# Altium integrated library BK1096.IntLib: 37 symbols
Pins are listed as number, name and electrical type; pins without a type are passive.

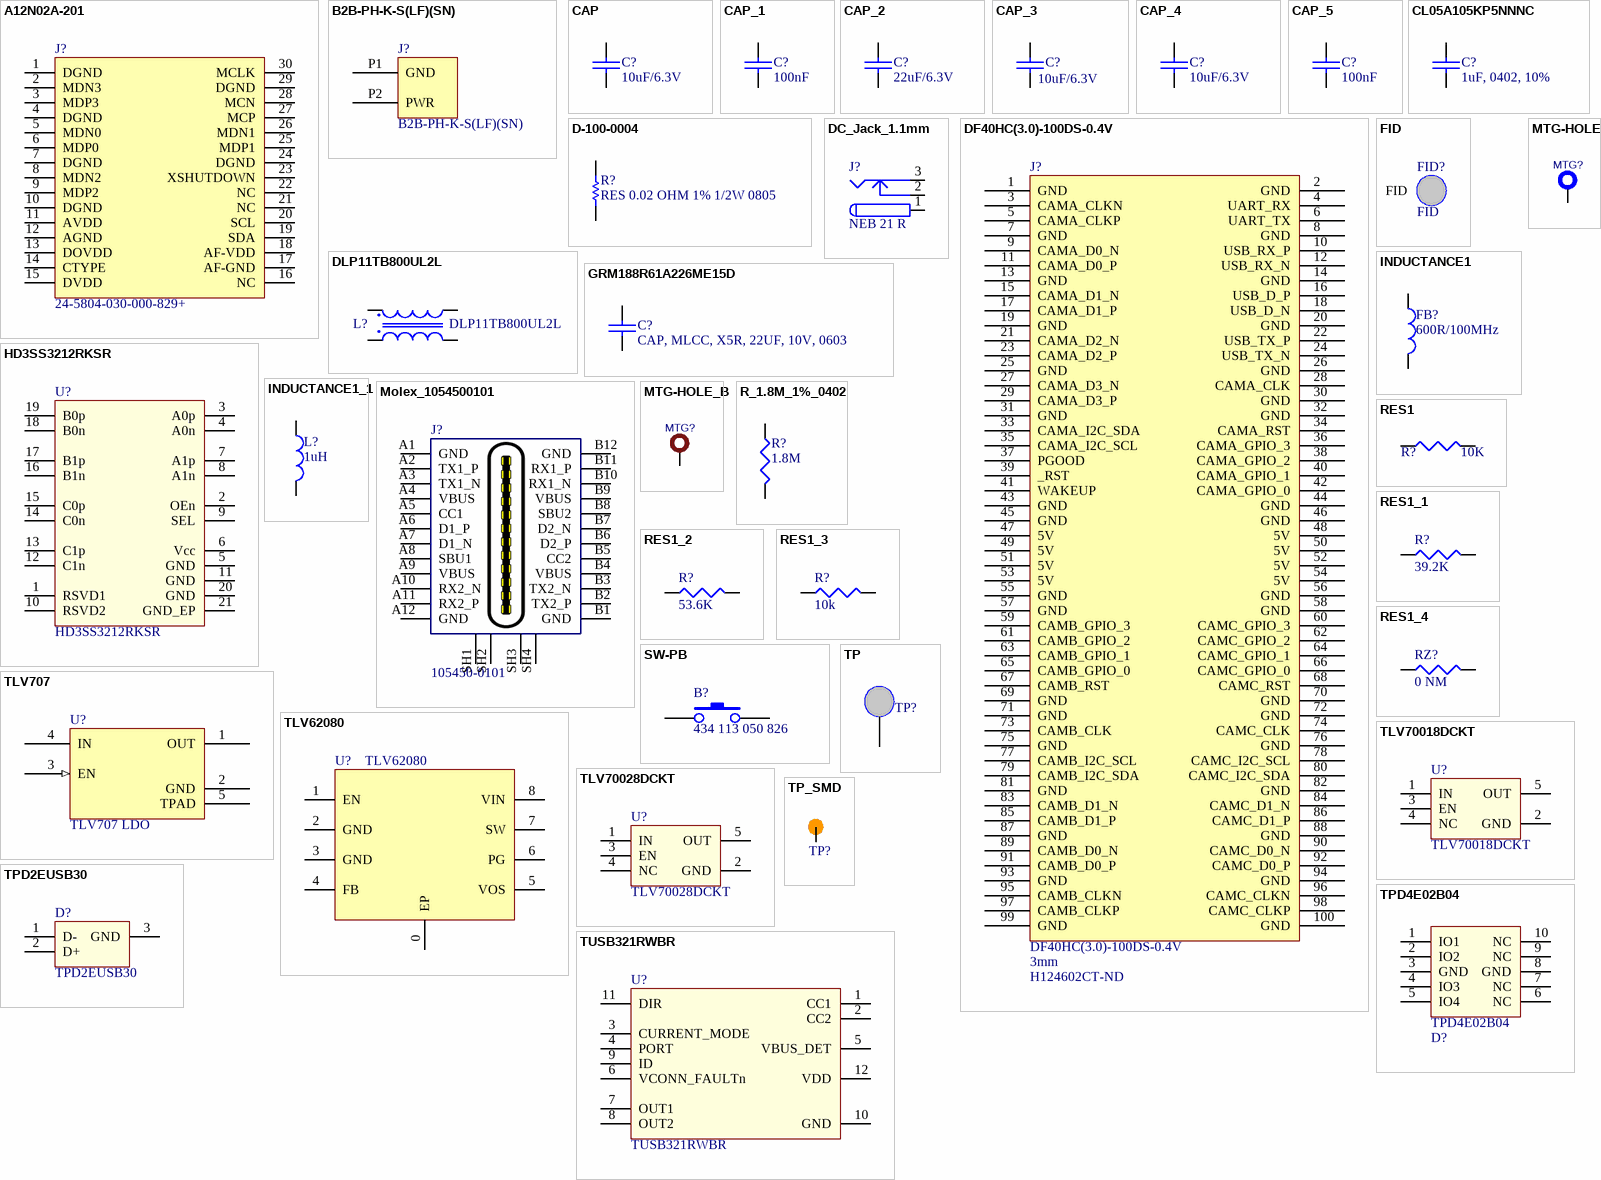
[diagram p0: symbols A12N02A-201 to TUSB321RWBR]

## A12N02A-201
designator J?, comment 24-5804-030-000-829+
Series 5804 board to board 0.4mm pitch 30 way connector; MAN: AVX/KYOCERA; MAN PN: 24-5804-030-000-829+
footprint A12N02A-201
pins: 1 DGND, 2 MDN3, 3 MDP3, 4 DGND, 5 MDN0, 6 MDP0, 7 DGND, 8 MDN2, 9 MDP2, 10 DGND, 11 AVDD, 12 AGND, 13 DOVDD, 14 CTYPE, 15 DVDD, 16 NC, 17 AF-GND, 18 AF-VDD, 19 SDA, 20 SCL, 21 NC, 22 NC, 23 XSHUTDOWN, 24 DGND, 25 MDP1, 26 MDN1, 27 MCP, 28 MCN, 29 DGND, 30 MCLK

## B2B-PH-K-S(LF)(SN)
designator J?
CONN HEADER VERT 2POS 2MM; Manufacturer: JST; Number of Positions: 2; Connector Type: Male Pin; Current Rating: 2A; Gender: Male; Contact Resistance: 20mR; Insulation Resistance: 1MR; Voltage Rating: 100V; Supplier 1: Digi-Key; Manufacturer Part Number: B2B-PH-K-S(LF)(SN); Stock 1: 216199; Pricing 1: 1 = 0.170000, 10 = 0.162000, 100 = 0.100200, 500 = 0.082880, 1000 = 0.072520, 5000 = 0.062160, 10000 = 0.060440 (USD); RoHS: Yes; Mount: Through Hole; Number of Pins: 2; Contact Plating: Tin; Color: Natural; Contact Material: Brass; Housing Material: Polyamide; Housing Color: White; Min Operating Temperature: -25°C; Max Operating Temperature: 85°C; Number of Rows: 1; Packaging: Bulk; Termination: Solder; Fastening Type: Detent; Number of Poles: 2; Number of Contacts: 2; Orientation: Straight; Max Current Rating: 2A; Max Voltage Rating (AC): 100V; Voltage Rating (AC): 100V; Working Voltage: 100V; Max Voltage Rating (DC): 100V; Length: 5.9mm; Height: 9.4mm; Pitch: 2mm; Width: 4.5mm; Contact Mating Length: 0.13inch; Depth: 4.5mm; Lead Pitch: 2mm; Lead Free: Lead Free; REACH SVHC: No SVHC; ComponentLink1URL: https://datasheet.ciiva.com/6747/80560-6747392.pdf?src-supplier=Newark; ComponentLink1Description: https://datasheet.ciiva.com/6747/80560-6747392.pdf?src-supplier=Newark; ComponentLink2URL: https://datasheet.ciiva.com/11746/0900766b8082f551-11746676.pdf?src-supplier=RSComponents; ComponentLink2Description: https://datasheet.ciiva.com/11746/0900766b8082f551-11746676.pdf?src-supplier=RSComponents; ComponentLink3URL: https://datasheet.ciiva.com/8052/80560-8052022.pdf?src-supplier=Element14; ComponentLink3Description: https://datasheet.ciiva.com/8052/80560-8052022.pdf?src-supplier=Element14; ComponentLink4URL: https://datasheet.ciiva.com/712/eph-712442.pdf?src-supplier=Digi-Key; ComponentLink4Description: https://datasheet.ciiva.com/712/eph-712442.pdf?src-supplier=Digi-Key; ComponentLink5URL: https://datasheet.ciiva.com/16422/b2b-ph-k-slfsn-16422715.pdf?src-supplier=Future+Electronics; ComponentLink5Description: https://datasheet.ciiva.com/16422/b2b-ph-k-slfsn-16422715.pdf?src-supplier=Future+Electronics; Supplier Part Number 1: 455-1704-ND
footprint *JST_B2B-PH-K-S(LF)(SN)
pins: P1 GND, P2 PWR

## CAP
designator C?, comment 10uF/6.3V
SMD Multilayer Ceramic Capacitor, 0603 [1608 Metric], 10 µF, 6.3 V, ± 20%, X5R; MAN: Yageo(PHYCOM); MAN PN: CC0603MRX5R5BB106; ICCO PN: MV122009; DIST: Farnell; DIST PN: 1458902
footprint 0603 (chip 0603)
footprint CAPC0603(1608)55_M (Chip Capacitor, Body 1.6x0.8mm, Height 0.55mm, IPC Low Density)
footprint CAPC0603(1608)55_N (Chip Capacitor, Body 1.6x0.8mm, Height 0.55mm, IPC Medium Density)
pins: 1, 2

## CAP_1
designator C?, comment 100nF
SMD Multilayer Ceramic Capacitor, 0402 [1005 Metric], 0.1 µF, 10 V, ± 10%, X5R; MAN: Kemet; MAN PN: C0402C104K8PACTU; ICCO PN: MV122005; DIST: Farnell; DIST PN: 2392235
footprint 0402 (chip 0402)
footprint CAPC0402(1005)60_M (Chip Capacitor, Body 1.0x0.5mm, Height 0.6mm, IPC Low Density)
footprint CAPC0402(1005)60_N (Chip Capacitor, Body 1.0x0.5mm, Height 0.6mm, IPC Medium Density)
pins: 1, 2

## CAP_2
designator C?, comment 22uF/6.3V
SMD Multilayer Ceramic Capacitor, 0805 [2012 Metric], 22 µF, 6.3 V, ± 10%, X5R; MAN: TAIYO YUDEN; MAN PN: JMK212BJ226KG-T; ICCO PN: MV122020; DIST PN: 2113069; DIST: Farnell
footprint 0805 (chip 0805)
pins: 1, 2

## CAP_3
designator C?, comment 10uF/6.3V
CERAMIC CAPACITOR, 10UF, 6.3V, X5R, 20%, 0805; MAN: TAIYO YUDEN; MAN PN: JMK212BJ106MG-T; ICCO PN: M1V10010; DIST PN: 2372273; DIST: Farnell
footprint 0805 (chip 0805)
pins: 1, 2

## CAP_4
designator C?, comment 10uF/6.3V
SMD Multilayer Ceramic Capacitor, 0402 [1005 Metric], 10 µF, 6.3 V, ± 20%, X5R; E - MFG: MuRata; F - MFG P/N: GRM155R60J106ME44D
footprint CAP_0402
footprint CAPC0402(1005)70_L (Chip Capacitor, Body 1.0x0.5mm, Height 0.7mm, IPC High Density)
footprint CAPC0402(1005)70_N (Chip Capacitor, Body 1.0x0.5mm, Height 0.7mm, IPC Medium Density)
pins: 1, 2

## CAP_5
designator C?, comment 100nF
SMD Multilayer Ceramic Capacitor, 0201 [0603 Metric], 0.1 µF, 6.3 V, ± 10%, X5R; B - Value: 0.1uF; C - Notes: 0201  0.1 µF, 6.3 V, ± 10%, X5R; E - MFG: MuRata; F - MFG P/N: GRM033R60J104KE19D
footprint CAPC0201(0603)33_M (Chip Capacitor, Body 0.6x0.3mm, Height 0.33mm, IPC Low Density)
footprint CAPC0201(0603)33_N (Chip Capacitor, Body 0.6x0.3mm, Height 0.33mm, IPC Medium Density)
footprint CAPC0201(0603)33_L (Chip Capacitor, Body 0.6x0.3mm, Height 0.33mm, IPC High Density)
pins: 1, 2

## CL05A105KP5NNNC
designator C?, comment 1uF, 0402, 10%
Cap Ceramic 1uF 10V X5R 10% SMD 0402 85C Paper T/R; Manufacturer: Samsung; Manufacturer Part Number: CL05A105KP5NNNC; Supplier 1: Digi-Key; Stock 1: 13690251; Pricing 1: 1 = 0.10000, 10 = 0.04200, 100 = 0.01880, 500 = 0.01340, 1000 = 0.01053, 2500 = 0.00958, 5000 = 0.00881 (USD); RoHS: Yes; Mount: Surface Mount; Case/Package: 0402; Case Code (Metric): 1005; Case Code (Imperial): 0402; Material: Ceramic; Contact Plating: Tin; Min Operating Temperature: -55°C; Max Operating Temperature: 85°C; Capacitance: 1uF; Tolerance: 10%; Packaging: Tape and Reel; Voltage Rating: 10V; Dielectric: X5R; Package Quantity: 1; Length: 1mm; Height: 0.5mm; Width: 0.02inch; Thickness: 0.022inch; Depth: 0.5mm; Radiation Hardening: No; ComponentLink1URL: https://datasheet.ciiva.com/15195/getdatasheetpartid-358390-15195630.pdf?src-supplier=Verical; ComponentLink1Description: https://datasheet.ciiva.com/15195/getdatasheetpartid-358390-15195630.pdf?src-supplier=Verical; ComponentLink2URL: https://datasheet.ciiva.com/29198/459159-da-01-en-vs-kondensator-0402-29198341.pdf?src-supplier=Conrad; ComponentLink2Description: https://datasheet.ciiva.com/29198/459159-da-01-en-vs-kondensator-0402-29198341.pdf?src-supplier=Conrad
footprint CAP_0402 (Body: 1.0 x 0.5mm)
footprint CAPC0402(1005)70_L (Chip Capacitor, Body 1.0x0.5mm, Height 0.7mm, IPC High Density)
footprint CAPC0402(1005)70_N (Chip Capacitor, Body 1.0x0.5mm, Height 0.7mm, IPC Medium Density)
pins: 1, 2

## D-100-0004
designator R?, comment RES 0.02 OHM 1% 1/2W 0805
footprint RESC0805(2012)_M (Chip Resistor, Body 2.0x1.3mm, IPC Low Density)
footprint RESC0805(2012)_N (Chip Resistor, Body 2.0x1.3mm, IPC Medium Density)
pins: 1, 2

## DC_Jack_1.1mm
designator J?, comment NEB 21 R
DC Jack 1.95mm ID 6.0mm OD 3A; MAN: LUMBERG; ICCO PN: MV182071; DIST: Farnell; DIST PN: 1217037; MAN PN: NEB 21 R
footprint NEB_21_R (DC Jack 1.95mm ID 6.0mm OD 3A)
pins: 1 (power), 2 (power), 3 (power)

## DF40HC(3.0)-100DS-0.4V
designator J?  Mated Stacking Heights: 3mm  Supplier Part Number 1: H124602CT-ND
CONN RCPT 100POS 0.4MM SMD GOLD; Manufacturer 1: Hirose; Manufacturer Part Number 1: DF40HC(3.0)-100DS-0.4V(58; Connector Type: Receptacle; Number of Positions: 100; Pitch: 0.016inch; Supplier 1: Digi-Key; Stock 1: 867; Pricing 1: 1=2.75000, 10=2.64000, 25=2.42000, 50=2.31000, 100=2.20000, 250=1.92500, 500=1.87000 (USD); RoHS: Yes; Mount: Surface Mount; Contact Plating: Gold; Packaging: Tape and Reel; Number of Rows: 2; Package Quantity: 1000; Lead Free: Lead Free; ComponentLink1URL: https://datasheet.ciiva.com/46636/ed-df40-20140305-46636517.pdf?src-supplier=Digi-Key; ComponentLink1Description: https://datasheet.ciiva.com/46636/ed-df40-20140305-46636517.pdf?src-supplier=Digi-Key; ComponentLink2URL: https://datasheet.ciiva.com/18562/ed-df40-20140305-18562189.pdf?src-supplier=Digi-Key; ComponentLink2Description: https://datasheet.ciiva.com/18562/ed-df40-20140305-18562189.pdf?src-supplier=Digi-Key
footprint DF40HC-3.0-100DS-0.4V (CONN HDR 100POS 0.4MM SMD GOLD)
pins: 1 GND, 2 GND, 3 CAMA_CLKN, 4 UART_RX, 5 CAMA_CLKP, 6 UART_TX, 7 GND, 8 GND, 9 CAMA_D0_N, 10 USB_RX_P, 11 CAMA_D0_P, 12 USB_RX_N, 13 GND, 14 GND, 15 CAMA_D1_N, 16 USB_D_P, 17 CAMA_D1_P, 18 USB_D_N, 19 GND, 20 GND, 21 CAMA_D2_N, 22 USB_TX_P, 23 CAMA_D2_P, 24 USB_TX_N, 25 GND, 26 GND, 27 CAMA_D3_N, 28 CAMA_CLK, 29 CAMA_D3_P, 30 GND, 31 GND, 32 GND, 33 CAMA_I2C_SDA, 34 CAMA_RST, 35 CAMA_I2C_SCL, 36 CAMA_GPIO_3, 37 PGOOD, 38 CAMA_GPIO_2, 39 _RST, 40 CAMA_GPIO_1, 41 WAKEUP, 42 CAMA_GPIO_0, 43 GND, 44 GND, 45 GND, 46 GND, 47 5V, 48 5V, 49 5V, 50 5V, 51 5V, 52 5V, 53 5V, 54 5V, 55 GND, 56 GND, 57 GND, 58 GND, 59 CAMB_GPIO_3, 60 CAMC_GPIO_3, 61 CAMB_GPIO_2, 62 CAMC_GPIO_2, 63 CAMB_GPIO_1, 64 CAMC_GPIO_1, 65 CAMB_GPIO_0, 66 CAMC_GPIO_0, 67 CAMB_RST, 68 CAMC_RST, 69 GND, 70 GND, 71 GND, 72 GND, 73 CAMB_CLK, 74 CAMC_CLK, 75 GND, 76 GND, 77 CAMB_I2C_SCL, 78 CAMC_I2C_SCL, 79 CAMB_I2C_SDA, 80 CAMC_I2C_SDA, 81 GND, 82 GND, 83 CAMB_D1_N, 84 CAMC_D1_N, 85 CAMB_D1_P, 86 CAMC_D1_P, 87 GND, 88 GND, 89 CAMB_D0_N, 90 CAMC_D0_N, 91 CAMB_D0_P, 92 CAMC_D0_P, 93 GND, 94 GND, 95 CAMB_CLKN, 96 CAMC_CLKN, 97 CAMB_CLKP, 98 CAMC_CLKP, 99 GND, 100 GND

## DLP11TB800UL2L
designator L?
CMC 150MA 2LN 80 OHM SMD; E - MFG: MuRata; F - MFG P/N: DLP11TB800UL2L
footprint CHOKE_0504 (Diff pair choke such as Murata DLP11TB800UL2L)
pins: 1, 2, 3, 4
text: .

## FID
designator FID?  (no BOM)
Fiducial mark; MAN PN: No part on PCB; MAN: Fiducial
footprint FIDUCIAL_1MM
pins: FID (in)

## GRM188R61A226ME15D
designator C?, comment CAP, MLCC, X5R, 22UF, 10V, 0603
Manufacturer 1: *
footprint CAPC0603(1608)100_N (Chip Capacitor, Body 1.6x0.8mm, Height 1.0mm, IPC Medium Density)
pins: 1, 2

## HD3SS3212RKSR
designator U?
Two Channel Differential 2:1/1:2 10Gbps Mux/Demux; E - MFG: TEXAS INSTRUMENTS; F - MFG P/N: HD3SS3212RKSR
footprint VQFN-20 (Footprint not found)
pins: 1 RSVD1, 2 OEn, 3 A0p, 4 A0n, 5 GND, 6 Vcc, 7 A1p, 8 A1n, 9 SEL, 10 RSVD2, 11 GND, 12 C1n, 13 C1p, 14 C0n, 15 C0p, 16 B1n, 17 B1p, 18 B0n, 19 B0p, 20 GND, 21 GND_EP

## INDUCTANCE1
designator FB?, comment 600R/100MHz
Ferrite Bead, 600 ohm, 0805 [2012 Metric], 2 A, 0.1 ohm, ± 25%; MAN: FAIR-RITE; MAN PN: 2508056017Y2; ICCO PN: MV142024; DIST: Farnell; DIST PN: 1838838RL
footprint 0805
footprint 1206
pins: 1, 2

## INDUCTANCE1_1
designator L?, comment 1uH
FIXED IND 1UH 2.2A 55 MOHM SMD; MAN: Wurth; MAN PN: 744029001; ICCO PN: MV249002; DIST: Farnell; DIST PN: 1635825
footprint 744029001 (Footprint not found)
pins: 1, 2

## Molex_1054500101
designator J?, comment 105450-0101
USB 3.1 Type C Receptacle SMD RA; E - MFG: Molex; F - MFG P/N: 105450-0101
footprint Molex_105450-0101
pins: A1 GND, A2 TX1_P, A3 TX1_N, A4 VBUS, A5 CC1, A6 D1_P, A7 D1_N, A8 SBU1, A9 VBUS, A10 RX2_N, A11 RX2_P, A12 GND, B1 GND, B2 TX2_P, B3 TX2_N, B4 VBUS, B5 CC2, B6 D2_P, B7 D2_N, B8 SBU2, B9 VBUS, B10 RX1_N, B11 RX1_P, B12 GND, SH1 SH, SH2 SH, SH3 SH, SH4 SH

## MTG-HOLE
designator MTG?  (value not drawn)  (no BOM)
Mounting Hole; B - Value: Not a Part; A - Level: 0; Z - SMD or PTH: PTH; F - MFG P/N: Not a Part
footprint STANDOFF_M2X0.4_3MM (SMD standoff, such as 9774030243R by Wurth)
footprint SCREW_M2.5x4_RPi (M2.5x4 as on RaspPi 3B+)
footprint SCREW_4-40_CLOSE (3mm PTH w/ vias)
footprint SCREW_6-32_CLOSE (3.8mm PTH w/ vias)
footprint SCREW_6-32_SNUG (simple 3.6mm PTH intended for direct connect to GND plane)
pins: 1

## MTG-HOLE_B
designator MTG?, comment MTG-HOLE  (value not drawn)  (no BOM)
Mounting Hole; B - Value: Not a Part; A - Level: 0; Z - SMD or PTH: PTH; F - MFG P/N: Not a Part
footprint SCREW_4-40_CLOSE (3mm PTH w/ vias)
footprint SCREW_6-32_CLOSE (3.8mm PTH w/ vias)
footprint SCREW_6-32_SNUG (simple 3.6mm PTH intended for direct connect to GND plane)
footprint STANDOFF_M2X0.4_3MM (SMD standoff, such as 9774030243R by Wurth)
pins: 1

## R_1.8M_1%_0402
designator R?, comment 1.8M
RES SMD 1.8M 1% 0402 50V; E - MFG: YAGEO (PHYCOMP); F - MFG P/N: RC0402FR-071M8L
footprint RESC0402(1005)_M (Chip Resistor, Body 1.0x0.5mm, IPC Low Density)
footprint RESC0402(1005)_N (Chip Resistor, Body 1.0x0.5mm, IPC Medium Density)
pins: 1, 2

## RES1
designator R?, comment 10K
SMD Chip Resistor, 10 kohm, 75 V, 0603 [1608 Metric], 100 mW, ± 1%; MAN: WALSIN; MAN PN: WR06X1002FTL; ICCO PN: MV122008; DIST: Farnell; DIST PN: 2502397
footprint 0603 (chip 0603)
footprint 1206
footprint CAPC0603(1608)55_M (Chip Capacitor, Body 1.6x0.8mm, Height 0.55mm, IPC Low Density)
footprint RESC0603(1608)_N (Chip Resistor, Body 1.6x0.8mm, IPC Medium Density)
pins: 1, 2

## RES1_1
designator R?, comment 39.2K
SMD Chip Resistor, Anti-Surge, 39.2 kohm, 150 V, 0603 [1608 Metric], 250 mW, ± 1%; MAN PN: ERJPA3F3922V; MAN: Panasonic; ICCO PN: MV249003; DIST: Farnell; DIST PN: 2562012RL
footprint 0402 (chip 0402)
footprint 0603
pins: 1, 2

## RES1_2
designator R?, comment 53.6K
RES SMD 53.6K OHM 1% 1/10W 0603; MAN PN: CR0603-FX-5362ELF; MAN: Bourns Inc.; DIST: Digi-Key; DIST PN: CR0603-FX-5362ELFCT-ND
footprint 0402 (chip 0402)
footprint 0603
pins: 1, 2

## RES1_3
designator R?, comment 10k
SMD Chip Resistor, Thick Film, 10 kohm, 50 V, 0402, 100mW, ± 1%; E - MFG: Panasonic; F - MFG P/N: ERJ2RKF1002X
footprint RESC0402(1005)_M (Chip Resistor, Body 1.0x0.5mm, IPC Low Density)
footprint RESC0402(1005)_N (Chip Resistor, Body 1.0x0.5mm, IPC Medium Density)
pins: 1, 2

## RES1_4
designator RZ?, comment 0 NM
Thick Film Resistors - SMD 0603 Zero Ohms; E - MFG: Panasonic; F - MFG P/N: ERJ-3GEY0R00V
footprint RESC0603(1608)_M (Chip Resistor, Body 1.6x0.8mm, IPC Low Density)
footprint RESC0603(1608)_N (Chip Resistor, Body 1.6x0.8mm, IPC Medium Density)
pins: 1, 2

## SW-PB
designator B?, comment 434 113 050 826
Wurth 434 113 050 826; DIST: Farnell; DIST PN: 1868029; ICCO PN: M1V00020; MAN: Wurth; MAN PN: 434 113 050 826
footprint DTSM32N
pins: 1, 2

## TLV707
designator U?, comment TLV707 LDO
IC REG LDO 1V 0.2A 4X2SON; Manufacturer: Texas Instruments; Manufacturer Part Number: TLV70710DQNR; Output Current: 200mA; Number of Regulators: 1; Min Current Limit: 240mA; Quiescent Current: 25uA; Dropout Voltage: 250mV; Supplier 1: Digi-Key; Stock 1: 4380; Pricing 1: 1 = 0.46000, 10 = 0.37300, 100 = 0.25380, 500 = 0.19034, 1000 = 0.14276 (USD); RoHS: Yes; Mount: Surface Mount; Min Operating Temperature: -40°C; Max Operating Temperature: 125°C; Packaging: Tape and Reel; Package Quantity: 3000; Output Voltage: 1V; Lead Free: Lead Free; ComponentLink1URL: http://www.ti.com/lit/gpn/tlv707?src-supplier=Mouser; ComponentLink1Description: http://www.ti.com/lit/gpn/tlv707?src-supplier=Mouser; ComponentLink2URL: http://www.ti.com/lit/ds/symlink/tlv707.pdf?src-supplier=Digi-Key; ComponentLink2Description: http://www.ti.com/lit/ds/symlink/tlv707.pdf?src-supplier=Digi-Key
footprint DFN65P100X40-4L (DFN, 4-Leads, Body 1.00x1.00mm, Pitch 0.65mm, IPC High Density)
pins: 1 OUT (power), 2 GND (power), 3 EN (in), 4 IN (power), 5 TPAD

## TLV62080
designator U?
IC REG BUCK ADJ 1.2A SYNC 8WSON; ICCO PN: MV249006; MAN: TI; MAN PN: TLV62080DSGT; DIST: Mouser; DIST PN: 595-TLV62080DSGT
footprint WSON-8
pins: 0 EP, 1 EN, 2 GND, 3 GND, 4 FB, 5 VOS, 6 PG, 7 SW, 8 VIN

## TLV70018DCKT
designator U?
LDO, 200MA, 1.8V, 5SC70; MAN: TI; DIST PN: 1778221; DIST: Farnell; ICCO PN: MV198003; MAN PN: TLV70018DCKT
footprint SC70-5 (Footprint not found)
pins: 1 IN, 2 GND, 3 EN, 4 NC, 5 OUT

## TLV70028DCKT
designator U?
LDO, 200MA, 2.8V, 5SC70; MAN: TI; DIST PN: 1778222; DIST: Farnell; ICCO PN: MV200002; MAN PN: TLV70028DCKT
footprint SC70-5
pins: 1 IN, 2 GND, 3 EN, 4 NC, 5 OUT

## TP
designator TP?, comment TP NM  (value not drawn)  (no BOM)
TEST POIN; MAN: SMD TESTPOINT; MAN PN: SMD TESTPOINT
footprint TP1
footprint TP2
footprint TP_THT
footprint TP_SMD
pins: 1

## TP_SMD
designator TP?  (value not drawn)  (no BOM)
circular pad test point, SMD
footprint TP_0.75MM_SMD_NO-SILK (general purpose test point)
pins: 1

## TPD2EUSB30
designator D?
DIODE, ESD, DUAL, USB3.0, SOT-3; E - MFG: TI; F - MFG P/N: TPD2EUSB30ADRTR
footprint SOT-3
pins: 1 D-, 2 D+, 3 GND

## TPD4E02B04
designator D?
TVS DIODE 3.6VWM 8.8VC 10USON; E - MFG: TI; F - MFG P/N: TPD4E02B04DQAR
footprint DQA-10
pins: 1 IO1, 2 IO2, 3 GND, 4 IO3, 5 IO4, 6 NC, 7 NC, 8 GND, 9 NC, 10 NC

## TUSB321RWBR
designator U?
USB Type-C  ™ Configuration  Channel  Logic and Port Control  with VCONN; E - MFG: TI; F - MFG P/N: TUSB321RWBR
footprint X2QFN-12
pins: 1 CC1, 2 CC2, 3 CURRENT_MODE, 4 PORT, 5 VBUS_DET, 6 VCONN_FAULTn, 7 OUT1, 8 OUT2, 9 ID, 10 GND, 11 DIR, 12 VDD